# Altium footprint library Maxwell_LIB.PcbLib: 143 footprints (part 3 of 9)
Each footprint in its own frame and in the unit in brackets; x right, y up, seen from the top. Pads: shape width x height; smd on the part's side, far side on the other; paste and mask are expansions set on the pad; w line width, h text height; cw(c..) or ccw(c..) is an arc to the next point about the centre after c.
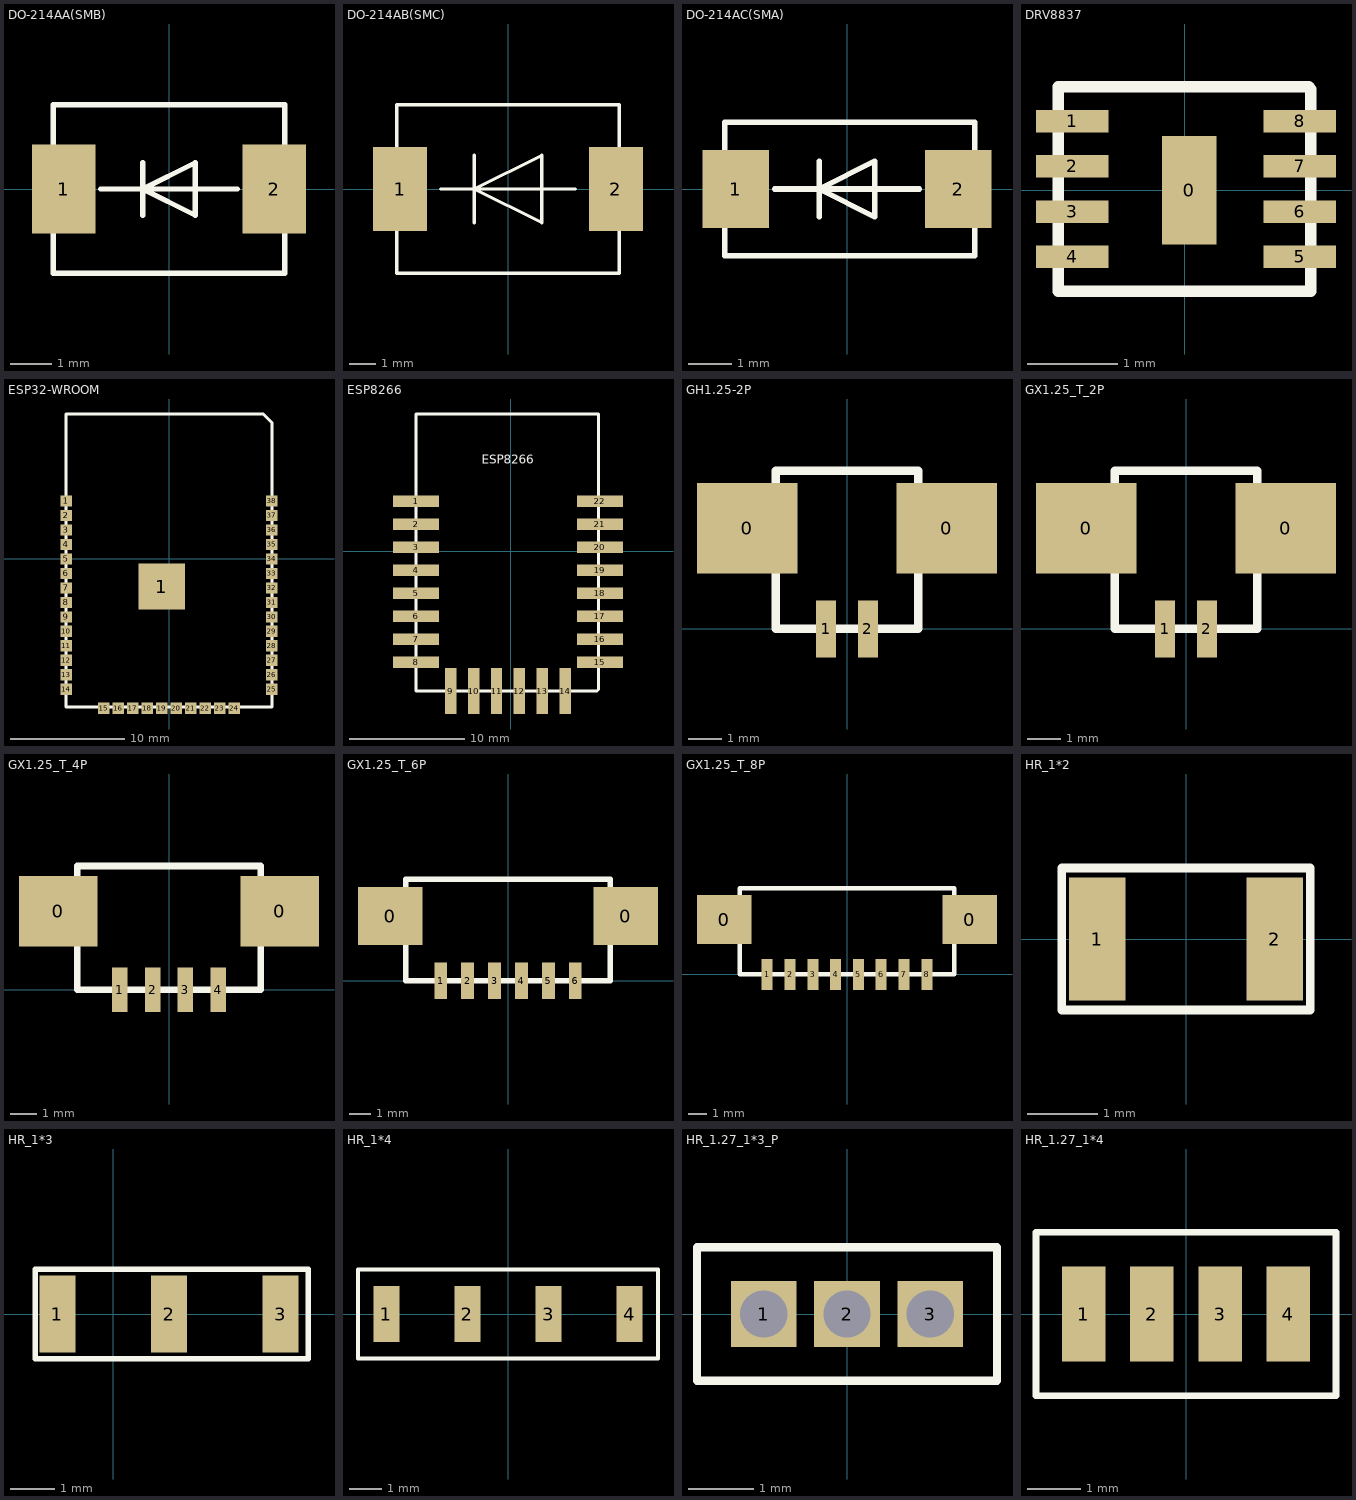
[diagram p2: the footprints below, top view; thin cyan lines are the x and y axes]

## DO-214AA(SMB) [mil]
pads (2):
  rect 60x85 smd: 1(-100,0) 2(100,0)
Top Overlay:
  lines w5: -65,0 65,0 ; -25,-25 -25,25 ; -110,-80 110,-80 110,80 -110,80 -110,-80 ; -25,0 25,-25 25,25 -25,0
3D body "User Library-DIOM5539X24.STEP": height 96.46, standoff 1.09, extent -108.26,-76.77 108.28,76.78

## DO-214AB(SMC) [mil]
pads (2):
  rect 80x125 smd: 1(-160,0) 2(160,0)
Top Overlay:
  lines w5: -100,0 100,0 ; -50,-50 -50,50 ; -165,-125 -165,125 165,125 165,-125 150,-125 -165,-125 ; -50,0 50,50 50,-50 -50,0
3D body "User Library-DIOM8261X24.STEP": height 94.49, standoff 1.29, extent -160.03,-120.07 160.04,120.09

## DO-214AC(SMA) [mil]
pads (2):
  rect 60x70 smd: 1(-100,0) 2(100,0)
Top Overlay:
  lines w5: -65,0 65,0 ; -25,-25 -25,25 ; -110,-60 115,-60 115,60 -110,60 -110,-60 ; -25,0 25,-25 25,25 -25,0
3D body "User Library-DIOM5528X26.STEP": height 102.36, standoff 1.02, extent -108.26,-55.11 108.28,55.12

## DRV8837 [mm]
pads (9):
  rect 0.6x1.2 smd: 0(0.051,0)
  rect 0.8x0.25 smd: 1(-1.245,0.762) 2(-1.245,0.262) 3(-1.245,-0.238) 4(-1.245,-0.738) 5(1.274,-0.738) 6(1.274,-0.238) 7(1.274,0.262) 8(1.274,0.762)
Top Overlay:
  lines w0.127: -1.397,-1.118 1.397,-1.118 1.397,1.118 1.372,1.143 -1.397,1.143 -1.397,-1.118
3D body "User Library-QFN8.STEP": height 0.94, standoff -0.01, extent -1.025,-0.984 1.075,1.016

## ESP32-WROOM [mm]
pads (39):
  rect 1x1 smd: 1(-9.017,5.08) 2(-9.017,3.81) 3(-9.017,2.54) 4(-9.017,1.27) 5(-9.017,0) 6(-9.017,-1.27) 7(-9.017,-2.54) 8(-9.017,-3.81) 9(-9.017,-5.08) 10(-9.017,-6.35) 11(-9.017,-7.62) 12(-9.017,-8.89) 13(-9.017,-10.16) 14(-9.017,-11.43) 15(-5.715,-13.081) 16(-4.445,-13.081) 17(-3.175,-13.081) 18(-1.905,-13.081) 19(-0.635,-13.081) 20(0.635,-13.081) 21(1.905,-13.081) 22(3.175,-13.081) 23(4.445,-13.081) 24(5.715,-13.081) 25(9.017,-11.43) 26(9.017,-10.16) 27(9.017,-8.89) 28(9.017,-7.62) 29(9.017,-6.35) 30(9.017,-5.08) 31(9.017,-3.81) 32(9.017,-2.54) 33(9.017,-1.27) 34(9.017,0) 35(9.017,1.27) 36(9.017,2.54) 37(9.017,3.81) 38(9.017,5.08)
  rect 4.064x4.064 smd: 1(-0.635,-2.413)
Top Overlay:
  lines w0.254: -9.017,-12.954 -9.017,12.7 8.255,12.7 9.017,11.938 9.017,-12.954 -9.017,-12.954
3D body "User Library-ESP32-WROOM.STEP": height 2.91, standoff -0.01, extent -9,-13.004 9,12.496

## ESP8266 [mm]
pads (22):
  rect 4x1 smd: 1(-8.255,4.318) 2(-8.255,2.318) 3(-8.255,0.318) 4(-8.255,-1.682) 5(-8.255,-3.682) 6(-8.255,-5.682) 7(-8.255,-7.682) 8(-8.255,-9.682) 15(7.747,-9.682) 16(7.747,-7.682) 17(7.747,-5.682) 18(7.747,-3.682) 19(7.747,-1.682) 20(7.747,0.318) 21(7.747,2.318) 22(7.747,4.318)
  rect 1x4 smd: 9(-5.255,-12.192) 10(-3.255,-12.192) 11(-1.255,-12.192) 12(0.745,-12.192) 13(2.745,-12.192) 14(4.745,-12.192)
Top Overlay:
  lines w0.254: -8.255,-12.192 -8.255,5.588 -8.255,11.938 7.62,11.938 7.62,-12.065 7.493,-12.192 -8.255,-12.192
  text "ESP8266" at -2.54,7.62 h0.76
3D body "EPS8266.STEP": height 2.65, standoff -0.04, extent -8.335,-11.091 7.675,12.914

## GH1.25-2P [mm]
pads (4):
  rect 3x2.7 smd: 0(-2.975,3) 0(2.975,3)
  rect 0.6x1.7 smd: 1(-0.625,0) 2(0.625,0)
Top Overlay:
  lines w0.254: -2.125,0 2.125,0 2.125,4.724 -2.125,4.724 -2.125,0
3D body "GH1.25-2p.stp": height 4.35, standoff 0, extent -2.75,0.089 2.75,4.939

## GX1.25_T_2P [mm]
pads (4):
  rect 3x2.7 smd: 0(-2.975,3) 0(2.975,3)
  rect 0.6x1.7 smd: 1(-0.625,0) 2(0.625,0)
Top Overlay:
  lines w0.254: -2.125,0 2.125,0 2.125,4.724 -2.125,4.724 -2.125,0
3D body "gx1.25_2p.stp": height 3.71, standoff 0.05, extent -3.662,-0.249 3.588,4.801

## GX1.25_T_4P [mm]
pads (6):
  rect 3x2.7 smd: 0(-4.225,3) 0(4.225,3)
  rect 0.6x1.7 smd: 1(-1.875,0) 2(-0.625,0) 3(0.625,0) 4(1.875,0)
Top Overlay:
  lines w0.254: -3.5,0 3.5,0 3.5,4.724 -3.5,4.724 -3.5,0
3D body "WT4p1_25.STEP": height 3.6, standoff -0.06, extent -4.85,-0.152 4.9,4.897

## GX1.25_T_6P [mm]
pads (8):
  rect 3x2.7 smd: 0(-5.475,3) 0(5.475,3)
  rect 0.6x1.7 smd: 1(-3.125,0) 2(-1.875,0) 3(-0.625,0) 4(0.625,0) 5(1.875,0) 6(3.125,0)
Top Overlay:
  lines w0.254: -4.75,0 -3.5,0 3.5,0 4.75,0 4.75,4.724 3.5,4.724 -3.5,4.724 -4.75,4.724 -4.75,0
3D body "gx1.25_6p.stp": height 3.71, standoff 0.05, extent -6.074,-0.579 6.176,4.47

## GX1.25_T_8P [mm]
pads (10):
  rect 3x2.7 smd: 0(-6.725,3) 0(6.725,3)
  rect 0.6x1.7 smd: 1(-4.375,0) 2(-3.125,0) 3(-1.875,0) 4(-0.625,0) 5(0.625,0) 6(1.875,0) 7(3.125,0) 8(4.375,0)
Top Overlay:
  lines w0.254: -5.875,0 -5.875,4.724 5.875,4.724 5.875,0 -5.875,0
3D body "WT8p1_25-1.STEP": height 3.71, standoff 0.05, extent -7.426,-0.224 7.324,4.826

## HR_1*2 [mm]
pads (2):
  rect 0.813x1.754 smd: 1(-1.27,0) 2(1.27,0)
Top Overlay:
  lines w0.127: -1.778,-1.016 -1.778,1.016 1.778,1.016 1.778,-1.016 -1.778,-1.016

## HR_1*3 [mm]
pads (3):
  rect 0.813x1.754 smd: 1(-1.27,0) 2(1.27,0) 3(3.81,0)
Top Overlay:
  lines w0.127: -1.778,-1.016 4.445,-1.016 4.445,1.016 -1.778,1.016 -1.778,-1.016

## HR_1*4 [mm]
pads (4):
  rect 0.813x1.754 smd: 1(-3.81,0) 2(-1.27,0) 3(1.27,0) 4(3.81,0)
Top Overlay:
  lines w0.127: -4.699,-1.397 4.699,-1.397 4.699,1.397 -4.699,1.397 -4.699,-1.397

## HR_1.27_1*3_P [mm]
pads (3):
  rect 1x1 hole 0.72: 1(-1.27,0) 2(0,0) 3(1.27,0)
Top Overlay:
  lines w0.127: -2.286,-1.016 2.286,-1.016 2.286,1.016 -2.286,1.016 -2.286,-1.016

## HR_1.27_1*4 [mil]
pads (4):
  rect 32x70 smd: 1(-75,0) 2(-25,0) 3(25,0) 4(75,0)
Top Overlay:
  lines w5: -110,-60 110,-60 110,60 -110,60 -110,-60